# Altium footprint library Generic Footprint.PcbLib: 160 footprints (part 17 of 20) (continued)
## Symbol_FCC-Logo-9x6mm_Silkscreen [mm] (continued)
1(4.703,1.92) 1(4.703,1.93) 1(4.703,1.95) 1(4.703,4.888) 1(4.703,4.898) 1(4.713,0.39) 1(4.713,1.349) 1(4.713,1.359) 1(4.713,1.92) 1(4.713,1.94) 1(4.713,4.307) 1(4.713,4.317) 1(4.713,4.337) 1(4.713,4.347) 1(4.713,4.878) 1(4.713,4.898) 1(4.724,1.328) 1(4.724,1.338) 1(4.724,1.879) 1(4.724,1.889) 1(4.724,1.899) 1(4.724,1.93) 1(4.724,4.317) 1(4.724,4.337) 1(4.724,4.347) 1(4.724,4.358) 1(4.724,4.888) 1(4.724,5.837) 1(4.724,5.857) 1(4.734,0.38) 1(4.734,1.338) 1(4.734,1.869) 1(4.734,1.889) 1(4.734,1.899) 1(4.734,1.91) 1(4.734,1.92) 1(4.734,4.327) 1(4.734,4.337) 1(4.734,4.347) 1(4.734,4.358) 1(4.734,4.368) 1(4.734,4.919) 1(4.734,5.837) 1(4.734,5.847) 1(4.744,1.328) 1(4.744,1.338) 1(4.744,1.349) 1(4.744,1.879) 1(4.744,1.889) 1(4.744,1.899) 1(4.744,4.358) 1(4.744,4.368) 1(4.744,4.378) 1(4.744,4.898) 1(4.744,4.919) 1(4.744,5.867) 1(4.754,0.369) 1(4.754,1.328) 1(4.754,1.859) 1(4.754,1.869) 1(4.754,4.388) 1(4.754,4.908) 1(4.754,4.939) 1(4.754,5.847) 1(4.754,5.857) 1(4.764,1.318) 1(4.764,1.848) 1(4.764,1.879) 1(4.764,4.368) 1(4.764,4.378) 1(4.764,4.398) 1(4.764,4.919) 1(4.764,4.939) 1(4.775,1.298) 1(4.775,1.838) 1(4.775,1.848) 1(4.775,1.859) 1(4.775,1.869) 1(4.775,4.378) 1(4.775,4.388) 1(4.775,4.409) 1(4.775,4.929) 1(4.775,4.949) 1(4.775,5.857) 1(4.775,5.877) 1(4.785,0.359) 1(4.785,0.38) 1(4.785,1.287) 1(4.785,1.298) 1(4.785,1.828) 1(4.785,1.838) 1(4.785,1.859) 1(4.785,4.388) 1(4.785,4.409) 1(4.785,4.419) 1(4.785,4.959) 1(4.785,5.867) 1(4.785,5.877) 1(4.785,5.888) 1(4.795,0.349) 1(4.795,0.38) 1(4.795,1.277) 1(4.795,1.287) 1(4.795,1.308) 1(4.795,1.818) 1(4.795,1.828) 1(4.795,1.838) 1(4.795,1.848) 1(4.795,4.409) 1(4.795,4.419) 1(4.795,4.429) 1(4.795,4.939) 1(4.795,4.949) 1(4.795,4.959) 1(4.795,5.867) 1(4.795,5.877) 1(4.805,0.359) 1(4.805,0.369) 1(4.805,1.267) 1(4.805,1.277) 1(4.805,1.287) 1(4.805,1.298) 1(4.805,1.808) 1(4.805,4.439) 1(4.805,4.949) 1(4.805,4.98) 1(4.805,5.877) 1(4.805,5.888) 1(4.805,5.898) 1(4.815,0.369) 1(4.815,1.257) 1(4.815,1.267) 1(4.815,1.277) 1(4.815,1.797) 1(4.815,1.818) 1(4.815,1.828) 1(4.815,4.419) 1(4.815,4.429) 1(4.815,4.449) 1(4.815,4.959) 1(4.815,4.98) 1(4.815,5.877) 1(4.826,0.339) 1(4.826,0.349) 1(4.826,0.359) 1(4.826,1.777) 1(4.826,1.787) 1(4.826,1.818) 1(4.826,4.429) 1(4.826,4.439) 1(4.826,4.449) 1(4.826,4.46) 1(4.826,5.888) 1(4.826,5.898) 1(4.826,5.908) 1(4.836,1.257) 1(4.836,1.767) 1(4.836,1.787) 1(4.836,4.439) 1(4.836,4.46) 1(4.836,4.47) 1(4.836,4.97) 1(4.846,1.267) 1(4.846,1.777) 1(4.846,1.787) 1(4.846,4.449) 1(4.846,4.46) 1(4.846,4.47) 1(4.846,4.48) 1(4.846,4.98) 1(4.846,5.898) 1(4.846,5.908) 1(4.846,5.918) 1(4.856,0.329) 1(4.856,0.339) 1(4.856,0.349) 1(4.856,1.757) 1(4.856,1.767) 1(4.856,4.49) 1(4.856,5) 1(4.866,1.257) 1(4.866,1.746) 1(4.866,1.757) 1(4.866,1.777) 1(4.866,4.47) 1(4.866,4.48) 1(4.866,4.5) 1(4.866,4.99) 1(4.866,5) 1(4.866,5.01) 1(4.866,5.908) 1(4.866,5.928) 1(4.877,0.318) 1(4.877,0.339) 1(4.877,1.247) 1(4.877,1.736) 1(4.877,1.746) 1(4.877,1.767) 1(4.877,4.48) 1(4.877,4.49) 1(4.877,4.511) 1(4.877,5) 1(4.877,5.01) 1(4.877,5.031) 1(4.887,0.329) 1(4.887,1.236) 1(4.887,1.726) 1(4.887,1.736) 1(4.887,1.757) 1(4.887,4.49) 1(4.887,4.511) 1(4.887,4.521) 1(4.887,5.01) 1(4.897,0.308) 1(4.897,0.329) 1(4.897,1.206) 1(4.897,1.716) 1(4.897,1.726) 1(4.897,1.736) 1(4.897,1.746) 1(4.897,4.511) 1(4.897,4.521) 1(4.897,4.531) 1(4.897,5.031) 1(4.897,5.041) 1(4.897,5.939) 1(4.907,0.298) 1(4.907,1.226) 1(4.907,1.706) 1(4.907,4.541) 1(4.907,5.021) 1(4.917,1.196) 1(4.917,1.206) 1(4.917,1.216) 1(4.917,1.716) 1(4.917,1.726) 1(4.917,4.521) 1(4.917,4.531) 1(4.917,5.031) 1(4.917,5.041) 1(4.917,5.051) 1(4.917,5.949) 1(4.928,0.288) 1(4.928,1.185) 1(4.928,1.685) 1(4.928,1.695) 1(4.928,1.706) 1(4.928,5.939) 1(4.938,1.185) 1(4.938,1.196) 1(4.938,1.206) 1(4.938,1.706) 1(4.938,1.716) 1(4.938,4.531) 1(4.938,4.541) 1(4.938,4.562) 1(4.938,5.041) 1(4.938,5.051) 1(4.938,5.939) 1(4.948,1.165) 1(4.948,1.196) 1(4.948,1.675) 1(4.948,1.685) 1(4.948,4.541) 1(4.948,4.551) 1(4.948,4.562) 1(4.948,4.572) 1(4.948,5.949) 1(4.948,5.959) 1(4.958,0.298) 1(4.958,1.665) 1(4.958,1.675) 1(4.958,4.582) 1(4.958,5.051) 1(4.968,0.278) 1(4.968,0.298) 1(4.968,1.165) 1(4.968,1.185) 1(4.968,1.685) 1(4.968,4.562) 1(4.968,4.572) 1(4.968,4.592) 1(4.968,5.061) 1(4.979,0.288) 1(4.979,1.155) 1(4.979,1.655) 1(4.979,1.675) 1(4.979,4.572) 1(4.979,4.582) 1(4.979,5.949) 1(4.979,5.959) 1(4.979,5.969) 1(4.989,1.175) 1(4.989,1.644) 1(4.989,1.665) 1(4.989,4.582) 1(4.989,4.602) 1(4.989,5.072) 1(4.989,5.092) 1(4.999,1.155) 1(4.999,1.624) 1(4.999,1.634) 1(4.999,1.644) 1(4.999,1.655) 1(4.999,1.665) 1(4.999,4.613) 1(4.999,5.092) 1(4.999,5.102) 1(4.999,5.959) 1(4.999,5.969) 1(4.999,5.979) 1(5.009,0.267) 1(5.009,0.288) 1(5.009,1.165) 1(5.009,1.655) 1(5.009,4.623) 1(5.009,5.082) 1(5.019,0.257) 1(5.019,0.278) 1(5.019,1.155) 1(5.019,1.614) 1(5.019,1.644) 1(5.019,4.613) 1(5.019,5.102) 1(5.019,5.99) 1(5.03,0.257) 1(5.03,0.278) 1(5.03,3.011) 1(5.03,3.021) 1(5.03,3.032) 1(5.03,3.042) 1(5.03,3.052) 1(5.03,3.062) 1(5.03,3.072) 1(5.03,3.083) 1(5.03,3.093) 1(5.03,3.103) 1(5.03,3.113) 1(5.03,3.123) 1(5.03,3.134) 1(5.03,3.144) 1(5.03,3.154) 1(5.03,3.164) 1(5.03,3.174) 1(5.03,3.185) 1(5.03,3.195) 1(5.03,3.205) 1(5.03,3.215) 1(5.03,3.225) 1(5.03,4.633) 1(5.03,5.092) 1(5.03,5.112) 1(5.03,5.123) 1(5.04,0.247) 1(5.04,0.267) 1(5.04,1.145) 1(5.04,1.604) 1(5.04,1.614) 1(5.04,1.624) 1(5.04,2.94) 1(5.04,2.95) 1(5.04,2.96) 1(5.04,2.97) 1(5.04,2.981) 1(5.04,2.991) 1(5.04,3.001) 1(5.04,3.021) 1(5.04,3.032) 1(5.04,3.042) 1(5.04,3.052) 1(5.04,3.062) 1(5.04,3.072) 1(5.04,3.083) 1(5.04,3.093) 1(5.04,3.103) 1(5.04,3.113) 1(5.04,3.123) 1(5.04,3.134) 1(5.04,3.144) 1(5.04,3.154) 1(5.04,3.164) 1(5.04,3.174) 1(5.04,3.185) 1(5.04,3.195) 1(5.04,3.205) 1(5.04,3.215) 1(5.04,3.225) 1(5.04,3.236) 1(5.04,3.246) 1(5.04,3.256) 1(5.04,3.266) 1(5.04,3.276) 1(5.04,3.287) 1(5.04,3.297) 1(5.04,3.307) 1(5.04,4.613) 1(5.04,4.623) 1(5.04,4.643) 1(5.04,5.102) 1(5.04,5.123) 1(5.04,5.969) 1(5.04,5.979) 1(5.04,5.99) 1(5.04,6) 1(5.05,1.114) 1(5.05,1.134) 1(5.05,1.624) 1(5.05,2.94) 1(5.05,2.95) 1(5.05,2.96) 1(5.05,2.97) 1(5.05,2.981) 1(5.05,2.991) 1(5.05,3.001) 1(5.05,3.021) 1(5.05,3.032) 1(5.05,3.042) 1(5.05,3.052) 1(5.05,3.062) 1(5.05,3.072) 1(5.05,3.083) 1(5.05,3.093) 1(5.05,3.103) 1(5.05,3.113) 1(5.05,3.123) 1(5.05,3.134) 1(5.05,3.144) 1(5.05,3.154) 1(5.05,3.164) 1(5.05,3.174) 1(5.05,3.185) 1(5.05,3.195) 1(5.05,3.205) 1(5.05,3.215) 1(5.05,3.225) 1(5.05,3.246) 1(5.05,3.256) 1(5.05,3.266) 1(5.05,3.276) 1(5.05,3.287) 1(5.05,3.297) 1(5.05,3.307) 1(5.05,4.623) 1(5.05,4.633) 1(5.05,4.653) 1(5.05,5.112) 1(5.05,5.133) 1(5.06,1.593) 1(5.06,2.94) 1(5.06,2.95) 1(5.06,2.96) 1(5.06,2.97) 1(5.06,2.981) 1(5.06,2.991) 1(5.06,3.256) 1(5.06,3.266) 1(5.06,3.276) 1(5.06,3.287) 1(5.06,3.297) 1(5.06,4.633) 1(5.06,4.643) 1(5.06,4.664) 1(5.06,5.112) 1(5.06,5.979) 1(5.06,5.99) 1(5.07,0.237) 1(5.07,0.247) 1(5.07,0.257) 1(5.07,0.267) 1(5.07,1.104) 1(5.07,1.114) 1(5.07,1.124) 1(5.07,1.583) 1(5.07,1.614) 1(5.07,2.807) 1(5.07,2.828) 1(5.07,3.001) 1(5.07,3.246) 1(5.07,3.307) 1(5.07,3.419) 1(5.07,3.44) 1(5.07,4.653) 1(5.07,5.133) 1(5.07,5.143) 1(5.07,6.01) 1(5.081,1.573) 1(5.081,1.583) 1(5.081,1.593) 1(5.081,2.766) 1(5.081,2.777) 1(5.081,2.787) 1(5.081,2.807) 1(5.081,2.828) 1(5.081,2.879) 1(5.081,2.889) 1(5.081,2.899) 1(5.081,2.909) 1(5.081,2.919) 1(5.081,2.93) 1(5.081,3.317) 1(5.081,3.327) 1(5.081,3.338) 1(5.081,3.348) 1(5.081,3.358) 1(5.081,3.419) 1(5.081,3.44) 1(5.081,3.45) 1(5.081,3.46) 1(5.081,3.47) 1(5.081,3.48) 1(5.081,4.643) 1(5.081,4.653) 1(5.081,4.674) 1(5.081,5.123) 1(5.081,5.143) 1(5.081,5.153) 1(5.091,1.094) 1(5.091,1.114) 1(5.091,2.736) 1(5.091,2.746) 1(5.091,2.756) 1(5.091,2.766) 1(5.091,2.777) 1(5.091,2.787) 1(5.091,2.838) 1(5.091,2.848) 1(5.091,2.858) 1(5.091,2.868) 1(5.091,3.368) 1(5.091,3.378) 1(5.091,3.389) 1(5.091,3.399) 1(5.091,3.409) 1(5.091,3.45) 1(5.091,3.46) 1(5.091,3.47) 1(5.091,3.48) 1(5.091,3.491) 1(5.091,3.501) 1(5.091,3.511) 1(5.091,4.684) 1(5.091,5.133) 1(5.091,6.02) 1(5.101,0.227) 1(5.101,0.237) 1(5.101,0.247) 1(5.101,1.104) 1(5.101,1.563) 1(5.101,1.573) 1(5.101,1.583) 1(5.101,1.593) 1(5.101,2.715) 1(5.101,2.726) 1(5.101,2.736) 1(5.101,2.746) 1(5.101,2.756) 1(5.101,2.787) 1(5.101,2.797) 1(5.101,2.807) 1(5.101,2.817) 1(5.101,2.828) 1(5.101,3.419) 1(5.101,3.429) 1(5.101,3.44) 1(5.101,3.45) 1(5.101,3.46) 1(5.101,3.491) 1(5.101,3.501) 1(5.101,3.511) 1(5.101,3.521) 1(5.101,3.531) 1(5.101,5.153) 1(5.111,1.094) 1(5.111,1.553) 1(5.111,2.705) 1(5.111,2.736) 1(5.111,2.756) 1(5.111,2.766) 1(5.111,2.777) 1(5.111,3.47) 1(5.111,3.48) 1(5.111,3.491) 1(5.111,3.511) 1(5.111,3.542) 1(5.111,4.694) 1(5.121,1.073) 1(5.121,1.083) 1(5.121,1.104) 1(5.121,1.563) 1(5.121,1.573) 1(5.121,2.685) 1(5.121,2.695) 1(5.121,2.705) 1(5.121,2.715) 1(5.121,2.726) 1(5.121,2.746) 1(5.121,3.501) 1(5.121,3.521) 1(5.121,3.531) 1(5.121,3.552) 1(5.121,3.562) 1(5.121,4.684) 1(5.121,5.143) 1(5.132,0.237) 1(5.132,1.073) 1(5.132,1.083) 1(5.132,2.664) 1(5.132,2.675) 1(5.132,2.685) 1(5.132,2.705) 1(5.132,2.715) 1(5.132,2.726) 1(5.132,3.521) 1(5.132,3.531) 1(5.132,3.552) 1(5.132,3.572) 1(5.132,3.582) 1(5.132,4.704) 1(5.132,6.03) 1(5.142,0.216) 1(5.142,1.063) 1(5.142,1.073) 1(5.142,1.094) 1(5.142,1.532) 1(5.142,1.542) 1(5.142,1.563) 1(5.142,2.654) 1(5.142,2.664) 1(5.142,2.675) 1(5.142,2.685) 1(5.142,3.552) 1(5.142,3.572) 1(5.142,3.582) 1(5.142,3.593) 1(5.142,4.684) 1(5.142,5.153) 1(5.152,0.206) 1(5.152,1.073) 1(5.152,1.083) 1(5.152,1.522) 1(5.152,2.664) 1(5.152,2.675) 1(5.152,3.572) 1(5.152,3.582) 1(5.152,4.704) 1(5.152,4.715) 1(5.152,4.725) 1(5.152,5.163) 1(5.152,6.041) 1(5.162,0.196) 1(5.162,1.063) 1(5.162,2.603) 1(5.162,2.634) 1(5.162,3.613) 1(5.162,4.715) 1(5.162,6.02) 1(5.172,1.512) 1(5.172,2.573) 1(5.172,2.583) 1(5.172,2.593) 1(5.172,2.603) 1(5.172,2.644) 1(5.172,3.603) 1(5.172,3.654) 1(5.172,3.664) 1(5.172,3.674) 1(5.172,4.704) 1(5.172,4.725) 1(5.172,5.184) 1(5.183,1.073) 1(5.183,1.522) 1(5.183,2.562) 1(5.183,2.583) 1(5.183,2.593) 1(5.183,2.603) 1(5.183,2.613) 1(5.183,2.624) 1(5.183,3.623) 1(5.183,3.633) 1(5.183,3.654) 1(5.183,3.664) 1(5.183,3.684) 1(5.183,3.695) 1(5.183,4.715) 1(5.183,4.735) 1(5.183,5.174) 1(5.183,5.184) 1(5.183,5.194) 1(5.183,6.02) 1(5.193,2.542) 1(5.193,2.552) 1(5.193,2.562) 1(5.193,2.573) 1(5.193,2.583) 1(5.193,2.593) 1(5.193,3.644) 1(5.193,3.654) 1(5.193,3.684) 1(5.193,3.705) 1(5.193,6.03) 1(5.193,6.041) 1(5.193,6.051) 1(5.203,1.063) 1(5.203,1.502) 1(5.203,1.512) 1(5.203,1.522) 1(5.203,2.542) 1(5.203,2.552) 1(5.203,2.562) 1(5.203,2.573) 1(5.203,3.664) 1(5.203,3.684) 1(5.203,3.695) 1(5.203,3.715) 1(5.203,4.725) 1(5.203,4.735) 1(5.203,4.745) 1(5.203,5.184) 1(5.203,5.194) 1(5.203,5.204) 1(5.213,0.186) 1(5.213,1.043) 1(5.213,2.522) 1(5.213,2.532) 1(5.213,2.552) 1(5.213,3.725) 1(5.223,1.032) 1(5.223,1.043) 1(5.223,1.053) 1(5.223,1.502) 1(5.223,1.512) 1(5.223,2.501) 1(5.223,2.511) 1(5.223,2.522) 1(5.223,2.542) 1(5.223,3.695) 1(5.223,3.725) 1(5.223,3.735) 1(5.223,3.746) 1(5.223,4.735) 1(5.223,4.755) 1(5.223,5.194) 1(5.223,5.204) 1(5.223,5.214) 1(5.223,6.03) 1(5.223,6.051) 1(5.223,6.061) 1(5.234,1.022) 1(5.234,1.481) 1(5.234,2.501) 1(5.234,2.511) 1(5.234,2.522) 1(5.234,3.735) 1(5.234,4.766) 1(5.234,5.225) 1(5.234,6.041) 1(5.244,0.196) 1(5.244,1.471) 1(5.244,1.491) 1(5.244,1.502) 1(5.244,2.501) 1(5.244,2.511) 1(5.244,3.725) 1(5.244,3.735) 1(5.244,4.766) 1(5.244,4.776) 1(5.244,5.204) 1(5.254,1.043) 1(5.254,1.481) 1(5.254,1.491) 1(5.254,2.491) 1(5.254,4.766) 1(5.254,5.214) 1(5.254,5.225) 1(5.254,5.235) 1(5.254,6.071) 1(5.264,0.176) 1(5.264,0.196) 1(5.264,1.012) 1(5.264,1.022) 1(5.264,1.461) 1(5.264,1.491) 1(5.264,2.45) 1(5.264,3.756) 1(5.264,3.776) 1(5.264,3.797) 1(5.264,4.786) 1(5.264,5.214) 1(5.264,6.051) 1(5.264,6.061) 1(5.274,0.186) 1(5.274,1.471) 1(5.274,1.481) 1(5.274,2.43) 1(5.274,2.44) 1(5.274,2.481) 1(5.274,3.766) 1(5.274,3.786) 1(5.274,3.797) 1(5.274,3.807) 1(5.274,4.776) 1(5.285,1.002) 1(5.285,1.012) 1(5.285,1.022) 1(5.285,2.42) 1(5.285,2.44) 1(5.285,2.46) 1(5.285,2.471) 1(5.285,3.797) 1(5.285,3.807) 1(5.285,3.817) 1(5.285,3.827) 1(5.285,4.796) 1(5.285,5.235) 1(5.285,5.245) 1(5.295,1.451) 1(5.295,1.471) 1(5.295,2.399) 1(5.295,2.409) 1(5.295,2.43) 1(5.295,2.44) 1(5.295,3.807) 1(5.295,3.817) 1(5.295,3.827) 1(5.295,3.837) 1(5.295,3.848) 1(5.295,5.225) 1(5.305,0.165) 1(5.305,0.176) 1(5.305,0.186) 1(5.305,0.992) 1(5.305,1.002) 1(5.305,2.409) 1(5.305,2.42) 1(5.305,2.43) 1(5.305,3.817) 1(5.305,3.827) 1(5.305,3.837) 1(5.305,3.848) 1(5.305,4.776) 1(5.305,4.786) 1(5.305,5.245) 1(5.305,6.061) 1(5.305,6.071) 1(5.305,6.081) 1(5.315,0.165) 1(5.315,1.012) 1(5.315,1.44) 1(5.315,1.461) 1(5.315,2.389) 1(5.315,2.42) 1(5.315,3.837) 1(5.315,3.858) 1(5.315,4.806) 1(5.325,0.165) 1(5.325,1.43) 1(5.325,1.461) 1(5.325,2.389) 1(5.325,2.409) 1(5.325,3.848) 1(5.325,3.858) 1(5.325,3.868) 1(5.325,4.786) 1(5.325,4.796) 1(5.336,0.155) 1(5.336,0.981) 1(5.336,0.992) 1(5.336,2.389) 1(5.336,3.858) 1(5.336,3.868) 1(5.336,3.878) 1(5.336,4.806) 1(5.336,4.817) 1(5.336,5.235) 1(5.336,6.092) 1(5.346,0.145) 1(5.346,0.176) 1(5.346,0.971) 1(5.346,1.002) 1(5.346,1.44) 1(5.346,1.451) 1(5.346,2.358) 1(5.346,2.379) 1(5.346,3.868) 1(5.346,3.878) 1(5.346,3.888) 1(5.346,3.899) 1(5.346,4.796) 1(5.346,4.806) 1(5.346,4.817) 1(5.346,4.827) 1(5.346,6.071) 1(5.346,6.102) 1(5.356,0.155) 1(5.356,0.165) 1(5.356,1.42) 1(5.356,1.43) 1(5.356,1.44) 1(5.356,1.451) 1(5.356,2.338) 1(5.356,2.348) 1(5.356,2.358) 1(5.356,2.369) 1(5.356,3.878) 1(5.356,3.888) 1(5.356,4.806) 1(5.356,5.245) 1(5.366,0.971) 1(5.366,0.981) 1(5.366,2.348) 1(5.366,2.358) 1(5.366,3.888) 1(5.366,3.899) 1(5.366,3.909) 1(5.376,0.992) 1(5.376,1.41) 1(5.376,1.42) 1(5.376,2.318) 1(5.376,2.328) 1(5.376,2.338) 1(5.376,2.348) 1(5.376,3.899) 1(5.376,3.909) 1(5.376,3.919) 1(5.376,4.806) 1(5.376,4.817) 1(5.376,4.827) 1(5.387,0.165) 1(5.387,1.43) 1(5.387,2.307) 1(5.387,2.328) 1(5.387,2.338) 1(5.387,3.909) 1(5.387,3.919) 1(5.387,3.929) 1(5.387,4.837) 1(5.387,5.255) 1(5.387,6.112) 1(5.397,0.135) 1(5.397,0.145) 1(5.397,0.155) 1(5.397,0.981) 1(5.397,2.307) 1(5.397,2.318) 1(5.397,2.328) 1(5.397,3.919) 1(5.397,3.929) 1(5.397,5.265) 1(5.397,5.286) 1(5.407,1.4) 1(5.407,1.41) 1(5.407,1.42) 1(5.407,2.318) 1(5.407,3.929) 1(5.407,4.827) 1(5.407,4.837) 1(5.407,4.847) 1(5.417,2.307) 1(5.417,3.939) 1(5.417,3.96) 1(5.427,0.951) 1(5.427,0.971) 1(5.427,3.95) 1(5.427,3.96) 1(5.427,3.97) 1(5.427,4.837) 1(5.427,4.857) 1(5.427,5.276) 1(5.427,5.286) 1(5.427,5.296) 1(5.427,6.102) 1(5.438,0.125) 1(5.438,0.145) 1(5.438,1.379) 1(5.438,1.389) 1(5.438,1.4) 1(5.438,1.41) 1(5.438,2.277) 1(5.438,2.297) 1(5.438,4.868) 1(5.438,6.102) 1(5.438,6.122) 1(5.448,2.277) 1(5.448,2.287) 1(5.448,3.96) 1(5.448,3.97) 1(5.448,3.98) 1(5.458,1.369) 1(5.458,1.379) 1(5.458,1.389) 1(5.458,1.4) 1(5.458,3.98) 1(5.458,3.99) 1(5.458,4.878) 1(5.458,5.296) 1(5.458,5.306) 1(5.458,6.102) 1(5.468,0.941) 1(5.468,0.951) 1(5.468,1.379) 1(5.468,1.389) 1(5.468,2.267) 1(5.468,2.277) 1(5.468,3.97) 1(5.468,3.99) 1(5.468,5.286) 1(5.468,6.102) 1(5.478,0.961) 1(5.478,2.236) 1(5.478,2.246) 1(5.478,2.256) 1(5.478,3.98) 1(5.478,3.99) 1(5.478,6.112) 1(5.489,2.226) 1(5.489,2.246) 1(5.489,5.316) 1(5.489,6.132) 1(5.499,0.114) 1(5.499,0.93) 1(5.499,1.359) 1(5.499,2.236) 1(5.499,2.246) 1(5.499,4.001) 1(5.499,4.868) 1(5.499,4.888) 1(5.499,5.296) 1(5.499,5.306) 1(5.499,5.327) 1(5.499,6.132) 1(5.509,0.92) 1(5.509,0.941) 1(5.509,0.951) 1(5.509,2.226) 1(5.509,2.236) 1(5.509,4.868) 1(5.519,4.011) 1(5.519,4.031) 1(5.519,4.878) 1(5.529,1.349) 1(5.529,4.031) 1(5.529,6.112) 1(5.529,6.132) 1(5.54,0.104) 1(5.54,2.226) 1(5.54,4.021) 1(5.54,4.052) 1(5.54,4.878) 1(5.54,5.306) 1(5.54,5.316) 1(5.54,5.327) 1(5.54,6.122) 1(5.54,6.143) 1(5.55,0.91) 1(5.55,0.92) 1(5.55,0.93) 1(5.55,0.941) 1(5.55,2.205) 1(5.55,2.216) 1(5.55,4.031) 1(5.55,4.052) 1(5.55,4.062) 1(5.55,4.888) 1(5.55,4.898) 1(5.55,5.337) 1(5.56,0.93) 1(5.56,1.338) 1(5.56,1.359) 1(5.56,2.185) 1(5.56,4.041) 1(5.57,2.175) 1(5.57,2.185) 1(5.57,2.195) 1(5.57,4.062) 1(5.57,4.072) 1(5.58,0.91) 1(5.58,1.359) 1(5.58,4.052) 1(5.58,4.072) 1(5.58,4.082) 1(5.58,4.888) 1(5.58,4.898) 1(5.58,5.316) 1(5.58,5.337) 1(5.591,0.9) 1(5.591,0.92) 1(5.591,2.165) 1(5.591,2.175) 1(5.591,4.062) 1(5.591,4.919) 1(5.591,5.347) 1(5.591,6.122) 1(5.591,6.132) 1(5.591,6.143) 1(5.591,6.153) 1(5.601,0.094) 1(5.601,1.328) 1(5.601,1.349) 1(5.601,2.154) 1(5.601,2.175) 1(5.601,2.185) 1(5.611,0.104) 1(5.611,0.114) 1(5.611,2.144) 1(5.611,2.165) 1(5.611,4.072) 1(5.611,4.082) 1(5.611,5.347) 1(5.621,0.114) 1(5.621,1.318) 1(5.621,1.328) 1(5.621,1.349) 1(5.621,4.898) 1(5.621,4.919) 1(5.631,1.338) 1(5.631,2.134) 1(5.631,2.144) 1(5.631,2.165) 1(5.631,4.082) 1(5.631,4.929) 1(5.631,5.327) 1(5.642,0.114) 1(5.642,0.89) 1(5.642,0.9) 1(5.652,0.91) 1(5.652,2.124) 1(5.652,2.134) 1(5.652,4.092) 1(5.652,4.908) 1(5.652,6.132) 1(5.662,0.104) 1(5.662,0.114) 1(5.662,1.338) 1(5.662,2.144) 1(5.662,4.919) 1(5.662,4.929) 1(5.662,4.939) 1(5.662,6.143) 1(5.662,6.153) 1(5.662,6.163) 1(5.672,0.084) 1(5.672,0.094) 1(5.672,1.308) 1(5.672,1.318) 1(5.672,1.328) 1(5.672,2.124) 1(5.672,4.103) 1(5.672,4.123) 1(5.682,0.89) 1(5.682,2.114) 1(5.682,5.337) 1(5.693,2.114) 1(5.693,2.134) 1(5.693,4.113) 1(5.693,4.123) 1(5.693,4.133) 1(5.693,5.357) 1(5.703,4.929) 1(5.703,4.949) 1(5.713,1.298) 1(5.713,1.308) 1(5.713,1.318) 1(5.713,4.143) 1(5.713,5.357) 1(5.723,4.123) 1(5.723,4.133) 1(5.723,4.154) 1(5.723,5.357) 1(5.723,6.173) 1(5.733,2.124) 1(5.733,5.357) 1(5.733,6.153) 1(5.733,6.163) 1(5.744,0.9) 1(5.744,2.114) 1(5.744,4.133) 1(5.744,4.143) 1(5.744,4.154) 1(5.744,5.347) 1(5.744,5.367) 1(5.744,5.378) 1(5.754,0.074) 1(5.754,0.084) 1(5.754,0.094) 1(5.754,2.083) 1(5.754,2.103) 1(5.754,4.164) 1(5.764,4.143) 1(5.764,4.939) 1(5.764,4.959) 1(5.774,1.287) 1(5.774,1.298) 1(5.774,1.308) 1(5.774,4.154) 1(5.774,4.164) 1(5.774,4.174) 1(5.774,4.939) 1(5.784,1.277) 1(5.784,2.073) 1(5.784,2.083) 1(5.784,2.093) 1(5.784,4.939) 1(5.805,4.174) 1(5.805,4.939) 1(5.805,5.357) 1(5.805,5.378) 1(5.805,5.388) 1(5.815,0.89) 1(5.815,2.063) 1(5.815,2.073) 1(5.815,4.164) 1(5.815,4.184) 1(5.815,4.97) 1(5.825,0.859) 1(5.825,0.879) 1(5.825,1.267) 1(5.825,1.298) 1(5.825,2.083) 1(5.825,4.184) 1(5.825,4.949) 1(5.825,6.163) 1(5.825,6.183) 1(5.835,0.063) 1(5.835,0.084) 1(5.835,0.859) 1(5.835,4.184) 1(5.846,0.074) 1(5.846,2.052) 1(5.846,4.184) 1(5.846,4.949) 1(5.856,0.859) 1(5.856,2.042) 1(5.856,2.063) 1(5.856,2.073) 1(5.866,4.949) 1(5.876,4.949) 1(5.876,4.98) 1(5.886,0.859) 1(5.886,4.97) 1(5.897,0.859) 1(5.897,2.042) 1(5.897,2.052) 1(5.897,2.063) 1(5.897,4.174) 1(5.897,5.378) 1(5.897,5.388) 1(5.897,5.398) 1(5.907,0.859) 1(5.907,1.257) 1(5.907,2.032) 1(5.917,0.849) 1(5.917,0.869) 1(5.937,2.032) 1(5.948,2.032) 1(5.948,4.184) 1(5.948,6.194) 1(5.958,2.032) 1(5.958,2.052) 1(5.958,4.194) 1(5.958,4.215) 1(5.968,6.204) 1(5.978,2.022) 1(5.978,4.97) 1(5.978,4.98) 1(5.978,4.99) 1(5.988,2.022) 1(5.999,0.043) 1(5.999,0.053) 1(5.999,0.063) 1(5.999,0.074) 1(6.009,1.247) 1(6.009,1.267) 1(6.009,2.022) 1(6.029,2.022) 1(6.039,2.022) 1(6.039,4.205) 1(6.039,4.215) 1(6.039,4.225) 1(6.05,2.042) 1(6.06,2.022) 1(6.06,5.388) 1(6.07,5.398) 1(6.07,5.408) 1(6.213,5.388) 1(6.223,5.398) 1(6.223,5.408) 1(6.233,2.022) 1(6.233,2.042) 1(6.243,2.022) 1(6.254,4.205) 1(6.254,4.215) 1(6.254,4.225) 1(6.264,1.247) 1(6.264,1.267) 1(6.264,2.022) 1(6.274,0.063) 1(6.284,0.043) 1(6.284,0.074) 1(6.284,2.022) 1(6.294,0.053) 1(6.294,2.022) 1(6.294,4.97) 1(6.294,4.98) 1(6.305,4.99) 1(6.315,2.022) 1(6.315,6.204) 1(6.325,2.032) 1(6.325,2.052) 1(6.325,6.194) 1(6.335,2.032) 1(6.335,4.194) 1(6.335,4.215) 1(6.345,4.184) 1(6.356,2.032) 1(6.366,0.849) 1(6.366,0.859) 1(6.366,0.869) 1(6.376,0.859) 1(6.376,1.257) 1(6.376,2.032) 1(6.386,0.859) 1(6.386,2.042) 1(6.386,2.052) 1(6.386,2.063) 1(6.386,5.378) 1(6.386,5.388) 1(6.386,5.398) 1(6.396,4.959) 1(6.396,4.97) 1(6.407,4.949) 1(6.407,4.98) 1(6.417,4.174) 1(6.417,4.959) 1(6.427,0.859) 1(6.427,2.042) 1(6.427,2.052) 1(6.427,2.063) 1(6.427,2.073) 1(6.427,4.949) 1(6.437,0.859) 1(6.447,0.063) 1(6.447,0.074) 1(6.447,0.084) 1(6.447,0.859) 1(6.447,1.267) 1(6.447,4.949) 1(6.447,6.163) 1(6.458,0.879) 1(6.458,1.298) 1(6.458,4.164) 1(6.458,4.184) 1(6.458,4.949) 1(6.458,6.183) 1(6.468,0.89) 1(6.468,2.063) 1(6.468,2.073) 1(6.468,2.083) 1(6.468,4.164) 